# Altium schematic symbol library Linear Technology Power Management Switching Regulator LTC1174-LTC3901.SchLib: 2647 symbols (part 47 of 197) (continued)
## LTC3528BEDDB-2#TRPBF (continued)

## LTC3528EDDB#PBF
designator U?
1 A, 1 MHz Synchronous Step-Up DC/DC Converter, 8-pin SON (DDB-8), -40 to 125 degC, Pb-Free; Manufacturer: Linear Technology; PartNumber: LTC3528EDDB#PBF; Number of Outputs: 1; DatasheetVersion: Rev. D; PackageVersion: Rev. B, 06/2010; PackageReference: DDB-8; PackageDescription: 8-Pin Plastic DFN, Body 3 x 2 mm, Pitch 0.5 mm; Supplier 1: Newark; Supplier Part Number 1: 78T3199; RoHS: TRUE; Mounting Technology: Surface Mount; Code_JEDEC: MO-229; ComponentLink1Description: Manufacturer URL; ComponentLink1URL: http://www.linear.com/; ComponentLink2Description: Datasheet; ComponentLink2URL: http://cds.linear.com/docs/en/datasheet/3528bfd.pdf; ComponentLink3Description: Package Specification; ComponentLink3URL: http://cds.linear.com/docs/en/packaging/DFN_8_05-08-1702.pdf
footprint LT-DDB-8_V (SON, 8-Leads, Body 3x2mm, Pitch 0.5mm, Thermal Pad 2.2x0.61mm)
pins: 1 ~{SHDN} (in) "Logic Controlled Shutdown Input. There is an internal 4Mohm pull-down resistor on this pin.", 2 FB (in) "Feedback Input. Connect resistor divider tap to this pin.", 3 PGOOD (oc) "Power Good Comparator Output. This open-drain output is low when VFB < 10% from its regulation voltage.", 4 VOUT (power) "Output Voltage Sense and Drain Connection of the Internal Synchronous Rectifier. PCB trace length from VOUT to the output filter capacitor (4.7uF minimum) should be as short and wide as possible.", 5 SW "Switch Pin. Connect inductor between SW and VIN. Keep PCB trace lengths as short and wide as possible to reduce EMI. If the inductor current falls to zero, or S\H\D\N\ is low, an internal anti-ringing switch is connected (See Datasheet)", 6 PGND (power) "Power Ground. Provide a short direct PCB path between PGND and the (-) side of the input and output capacitors.", 7 SGND (power) "Signal Ground. Provide a short direct PCB path between SGND and the (-) side of the input and output capacitors.", 8 VIN (power) "Battery Input Voltage. Connect a minimum of 1uF ceramic decoupling capacitor from this pin to ground.", 9 EP (power) "The exposed pad must be soldered to the PCB ground plane. It serves as another ground connection and as a means of conducting heat away from the die."

## LTC3528EDDB#TRMPBF
designator U?
1 A, 1 MHz Synchronous Step-Up DC/DC Converter, 8-pin SON (DDB-8), -40 to 125 degC, Pb-Free, Mini Tape and Reel; Manufacturer: Linear Technology; PartNumber: LTC3528EDDB#TRMPBF; Number of Outputs: 1; DatasheetVersion: Rev. D; PackageVersion: Rev. B, 06/2010; PackageReference: DDB-8; PackageDescription: 8-Pin Plastic DFN, Body 3 x 2 mm, Pitch 0.5 mm; Supplier 1: Digi-Key; Supplier Part Number 1: LTC3528EDDB#TRMPBFTR-ND; Supplier 2: Digi-Key; Supplier Part Number 2: LTC3528EDDB#TRMPBFCT-ND; Supplier 3: Digi-Key; Supplier Part Number 3: LTC3528EDDB#TRMPBFDKR-ND; Packing: Mini Tape and Reel; RoHS: TRUE; Mounting Technology: Surface Mount; Code_JEDEC: MO-229; ComponentLink1Description: Manufacturer URL; ComponentLink1URL: http://www.linear.com/; ComponentLink2Description: Datasheet; ComponentLink2URL: http://cds.linear.com/docs/en/datasheet/3528bfd.pdf; ComponentLink3Description: Package Specification; ComponentLink3URL: http://cds.linear.com/docs/en/packaging/DFN_8_05-08-1702.pdf
footprint LT-DDB-8_V (SON, 8-Leads, Body 3x2mm, Pitch 0.5mm, Thermal Pad 2.2x0.61mm)
pins: 1 ~{SHDN} (in) "Logic Controlled Shutdown Input. There is an internal 4Mohm pull-down resistor on this pin.", 2 FB (in) "Feedback Input. Connect resistor divider tap to this pin.", 3 PGOOD (oc) "Power Good Comparator Output. This open-drain output is low when VFB < 10% from its regulation voltage.", 4 VOUT (power) "Output Voltage Sense and Drain Connection of the Internal Synchronous Rectifier. PCB trace length from VOUT to the output filter capacitor (4.7uF minimum) should be as short and wide as possible.", 5 SW "Switch Pin. Connect inductor between SW and VIN. Keep PCB trace lengths as short and wide as possible to reduce EMI. If the inductor current falls to zero, or S\H\D\N\ is low, an internal anti-ringing switch is connected (See Datasheet)", 6 PGND (power) "Power Ground. Provide a short direct PCB path between PGND and the (-) side of the input and output capacitors.", 7 SGND (power) "Signal Ground. Provide a short direct PCB path between SGND and the (-) side of the input and output capacitors.", 8 VIN (power) "Battery Input Voltage. Connect a minimum of 1uF ceramic decoupling capacitor from this pin to ground.", 9 EP (power) "The exposed pad must be soldered to the PCB ground plane. It serves as another ground connection and as a means of conducting heat away from the die."

## LTC3528EDDB#TRPBF
designator U?
1 A, 1 MHz Synchronous Step-Up DC/DC Converter, 8-pin SON (DDB-8), -40 to 125 degC, Pb-Free, Tape and Reel; Manufacturer: Linear Technology; PartNumber: LTC3528EDDB#TRPBF; Number of Outputs: 1; DatasheetVersion: Rev. D; PackageVersion: Rev. B, 06/2010; PackageReference: DDB-8; PackageDescription: 8-Pin Plastic DFN, Body 3 x 2 mm, Pitch 0.5 mm; Supplier 1: Digi-Key; Supplier Part Number 1: LTC3528EDDB#TRPBF-ND; Supplier 2: Newark; Supplier Part Number 2: 56M7923; Packing: Tape and Reel; RoHS: TRUE; Mounting Technology: Surface Mount; Code_JEDEC: MO-229; ComponentLink1Description: Manufacturer URL; ComponentLink1URL: http://www.linear.com/; ComponentLink2Description: Datasheet; ComponentLink2URL: http://cds.linear.com/docs/en/datasheet/3528bfd.pdf; ComponentLink3Description: Package Specification; ComponentLink3URL: http://cds.linear.com/docs/en/packaging/DFN_8_05-08-1702.pdf
footprint LT-DDB-8_V (SON, 8-Leads, Body 3x2mm, Pitch 0.5mm, Thermal Pad 2.2x0.61mm)
pins: 1 ~{SHDN} (in) "Logic Controlled Shutdown Input. There is an internal 4Mohm pull-down resistor on this pin.", 2 FB (in) "Feedback Input. Connect resistor divider tap to this pin.", 3 PGOOD (oc) "Power Good Comparator Output. This open-drain output is low when VFB < 10% from its regulation voltage.", 4 VOUT (power) "Output Voltage Sense and Drain Connection of the Internal Synchronous Rectifier. PCB trace length from VOUT to the output filter capacitor (4.7uF minimum) should be as short and wide as possible.", 5 SW "Switch Pin. Connect inductor between SW and VIN. Keep PCB trace lengths as short and wide as possible to reduce EMI. If the inductor current falls to zero, or S\H\D\N\ is low, an internal anti-ringing switch is connected (See Datasheet)", 6 PGND (power) "Power Ground. Provide a short direct PCB path between PGND and the (-) side of the input and output capacitors.", 7 SGND (power) "Signal Ground. Provide a short direct PCB path between SGND and the (-) side of the input and output capacitors.", 8 VIN (power) "Battery Input Voltage. Connect a minimum of 1uF ceramic decoupling capacitor from this pin to ground.", 9 EP (power) "The exposed pad must be soldered to the PCB ground plane. It serves as another ground connection and as a means of conducting heat away from the die."

## LTC3528EDDB-2#PBF
designator U?
1 A, 2 MHz Synchronous Step-Up DC/DC Converter, 8-pin SON (DDB-8), -40 to 125 degC, Pb-Free; Manufacturer: Linear Technology; PartNumber: LTC3528EDDB-2#PBF; Number of Outputs: 1; DatasheetVersion: Rev. B; PackageVersion: Rev. B, 06/2010; PackageReference: DDB-8; PackageDescription: 8-Pin Plastic DFN, Body 3 x 2 mm, Pitch 0.5 mm; Supplier 1: Farnell; Supplier Part Number 1: 2102650; Supplier 2: Newark; Supplier Part Number 2: 51R1507; RoHS: TRUE; Mounting Technology: Surface Mount; Code_JEDEC: MO-229; ComponentLink1Description: Manufacturer URL; ComponentLink1URL: http://www.linear.com/; ComponentLink2Description: Datasheet; ComponentLink2URL: http://cds.linear.com/docs/en/datasheet/35282fb.pdf; ComponentLink3Description: Package Specification; ComponentLink3URL: http://cds.linear.com/docs/en/packaging/DFN_8_05-08-1702.pdf
footprint LT-DDB-8_V (SON, 8-Leads, Body 3x2mm, Pitch 0.5mm, Thermal Pad 2.2x0.61mm)
pins: 1 ~{SHDN} (in) "Logic Controlled Shutdown Input. There is an internal 4M pull-down resistor on this pin.", 2 FB (in) "Feedback Input. Connect resistor divider tap to this pin.", 3 PGOOD (oc) "Power Good Comparator Output. This open-drain output is low when VFB < 10% from its regulation voltage.", 4 VOUT (in) "Output Voltage Sense and Drain Connection of the Internal Synchronous Rectifier. PCB trace length from VOUT to the output filter capacitor (4.7uF minimum) should be as short and wide as possible.", 5 SW "Switch Pin. Connect inductor between SW and VIN. Keep PCB trace lengths as short and wide as possible to reduce EMI. If the inductor current falls to zero, or S\H\D\N\ is low, an internal anti-ringing switch is connected (See Datasheet)", 6 PGND (power) "Power Ground. Provide a short direct PCB path between PGND and the (-) side of the input and output capacitors.", 7 SGND (power) "Signal Ground. Provide a short direct PCB path between SGND and the (-) side of the input and output capacitors.", 8 VIN (power) "Battery Input Voltage. Connect a minimum of 1uF ceramic decoupling capacitor from this pin to ground.", 9 EP (power) "The exposed pad must be soldered to the PCB ground plane. It serves as another ground connection and as a means of conducting heat away from the die."

## LTC3528EDDB-2#TRMPBF
designator U?
1 A, 2 MHz Synchronous Step-Up DC/DC Converter, 8-pin SON (DDB-8), -40 to 125 degC, Pb-Free, Mini Tape and Reel; Manufacturer: Linear Technology; PartNumber: LTC3528EDDB-2#TRMPBF; Number of Outputs: 1; DatasheetVersion: Rev. B; PackageVersion: Rev. B, 06/2010; PackageReference: DDB-8; PackageDescription: 8-Pin Plastic DFN, Body 3 x 2 mm, Pitch 0.5 mm; Supplier 1: Digi-Key; Supplier Part Number 1: LTC3528EDDB-2#TRMPBF-ND; Packing: Mini Tape and Reel; RoHS: TRUE; Mounting Technology: Surface Mount; Code_JEDEC: MO-229; ComponentLink1Description: Manufacturer URL; ComponentLink1URL: http://www.linear.com/; ComponentLink2Description: Datasheet; ComponentLink2URL: http://cds.linear.com/docs/en/datasheet/35282fb.pdf; ComponentLink3Description: Package Specification; ComponentLink3URL: http://cds.linear.com/docs/en/packaging/DFN_8_05-08-1702.pdf
footprint LT-DDB-8_V (SON, 8-Leads, Body 3x2mm, Pitch 0.5mm, Thermal Pad 2.2x0.61mm)
pins: 1 ~{SHDN} (in) "Logic Controlled Shutdown Input. There is an internal 4M pull-down resistor on this pin.", 2 FB (in) "Feedback Input. Connect resistor divider tap to this pin.", 3 PGOOD (oc) "Power Good Comparator Output. This open-drain output is low when VFB < 10% from its regulation voltage.", 4 VOUT (in) "Output Voltage Sense and Drain Connection of the Internal Synchronous Rectifier. PCB trace length from VOUT to the output filter capacitor (4.7uF minimum) should be as short and wide as possible.", 5 SW "Switch Pin. Connect inductor between SW and VIN. Keep PCB trace lengths as short and wide as possible to reduce EMI. If the inductor current falls to zero, or S\H\D\N\ is low, an internal anti-ringing switch is connected (See Datasheet)", 6 PGND (power) "Power Ground. Provide a short direct PCB path between PGND and the (-) side of the input and output capacitors.", 7 SGND (power) "Signal Ground. Provide a short direct PCB path between SGND and the (-) side of the input and output capacitors.", 8 VIN (power) "Battery Input Voltage. Connect a minimum of 1uF ceramic decoupling capacitor from this pin to ground.", 9 EP (power) "The exposed pad must be soldered to the PCB ground plane. It serves as another ground connection and as a means of conducting heat away from the die."

## LTC3528EDDB-2#TRPBF
designator U?
1 A, 2 MHz Synchronous Step-Up DC/DC Converter, 8-pin SON (DDB-8), -40 to 125 degC, Pb-Free, Tape and Reel; Manufacturer: Linear Technology; PartNumber: LTC3528EDDB-2#TRPBF; Number of Outputs: 1; DatasheetVersion: Rev. B; PackageVersion: Rev. B, 06/2010; PackageReference: DDB-8; PackageDescription: 8-Pin Plastic DFN, Body 3 x 2 mm, Pitch 0.5 mm; Supplier 1: Digi-Key; Supplier Part Number 1: LTC3528EDDB-2#TRPBF-ND; Packing: Tape and Reel; RoHS: TRUE; Mounting Technology: Surface Mount; Code_JEDEC: MO-229; ComponentLink1Description: Manufacturer URL; ComponentLink1URL: http://www.linear.com/; ComponentLink2Description: Datasheet; ComponentLink2URL: http://cds.linear.com/docs/en/datasheet/35282fb.pdf; ComponentLink3Description: Package Specification; ComponentLink3URL: http://cds.linear.com/docs/en/packaging/DFN_8_05-08-1702.pdf
footprint LT-DDB-8_V (SON, 8-Leads, Body 3x2mm, Pitch 0.5mm, Thermal Pad 2.2x0.61mm)
pins: 1 ~{SHDN} (in) "Logic Controlled Shutdown Input. There is an internal 4M pull-down resistor on this pin.", 2 FB (in) "Feedback Input. Connect resistor divider tap to this pin.", 3 PGOOD (oc) "Power Good Comparator Output. This open-drain output is low when VFB < 10% from its regulation voltage.", 4 VOUT (in) "Output Voltage Sense and Drain Connection of the Internal Synchronous Rectifier. PCB trace length from VOUT to the output filter capacitor (4.7uF minimum) should be as short and wide as possible.", 5 SW "Switch Pin. Connect inductor between SW and VIN. Keep PCB trace lengths as short and wide as possible to reduce EMI. If the inductor current falls to zero, or S\H\D\N\ is low, an internal anti-ringing switch is connected (See Datasheet)", 6 PGND (power) "Power Ground. Provide a short direct PCB path between PGND and the (-) side of the input and output capacitors.", 7 SGND (power) "Signal Ground. Provide a short direct PCB path between SGND and the (-) side of the input and output capacitors.", 8 VIN (power) "Battery Input Voltage. Connect a minimum of 1uF ceramic decoupling capacitor from this pin to ground.", 9 EP (power) "The exposed pad must be soldered to the PCB ground plane. It serves as another ground connection and as a means of conducting heat away from the die."

## LTC3529EDCB#PBF
designator U?
1.5 A, 1.5 MHz Step-Up DC/DC Converter, 8-pin SON (DCB-8), -40 to 85 degC, Pb-Free; Manufacturer: Linear Technology; PartNumber: LTC3529EDCB#PBF; Number of Outputs: 1; DatasheetVersion: Rev. B; PackageVersion: Rev. A, 06/2010; PackageReference: DCB-8; PackageDescription: 8-Pin Plastic DFN, Body 2 x 3 mm, Pitch 0.45 mm; Supplier 1: Newark; Supplier Part Number 1: 51P3122; RoHS: TRUE; Mounting Technology: Surface Mount; ComponentLink1Description: Manufacturer URL; ComponentLink1URL: http://www.linear.com/; ComponentLink2Description: Datasheet; ComponentLink2URL: http://cds.linear.com/docs/en/datasheet/3529fb.pdf; ComponentLink3Description: Package Specification; ComponentLink3URL: http://cds.linear.com/docs/en/packaging/DFN_8_05-08-1718.pdf
footprint LT-DCB-8_V (SON, 8-Leads, Body 3x2mm, Pitch 0.45mm, Thermal Pad 1.65x1.35mm)
pins: 1 VOUT (power) "Converter Output, Voltage Sense Input and Drain of the Internal Synchronous Rectifier MOSFET. Driver bias is derived from VOUT. PCB trace length from VOUT to the output filter capacitor(s) should be as short and wide as (See Datasheet)", 2 SW "Switch Node. This node connects to one side of the inductor. Keep PCB traces as short and wide as possible to reduce EMI and voltage overshoot. If the inductor current falls to zero, or S\H\D\N\ is low, an internal 100ohm (See Datasheet)", 3 ~{SHDN} (in) "Active-Low Shutdown Input. Forcing this pin above 1V enables the converter. Forcing this pin below 0.35V disables the converter. Do not float this pin.", 4 PGND (power) "High Current Ground Connection. The PCB trace connecting this pin to ground should be as short and as wide as possible.", 5 ~{FAULT} (oc) "Open-Drain Fault Indicator Output. Pulls low when an overcurrent condition exists for more than 22ms.", 6 SNSGND (power) "This pin must be connected to ground.", 7 RST (in) "Logic Input to Select Automatic Restart or Latchoff Following a Fault Shutdown. RST = High: Auto-reset mode. In this mode, the LTC3529 will automatically attempt to restart 22ms (typically) after a fault shutdown. RST = Low: (See Datasheet)", 8 VIN (power) "Input Supply Pin.", 9 EP (power) "Small Signal Ground. This is the ground reference for the internal circuitry of the LTC3529 and must be connected directly to ground."

## LTC3529EDCB#TRMPBF
designator U?
1.5 A, 1.5 MHz Step-Up DC/DC Converter, 8-pin SON (DCB-8), -40 to 85 degC, Pb-Free, Mini Tape and Reel; Manufacturer: Linear Technology; PartNumber: LTC3529EDCB#TRMPBF; Number of Outputs: 1; DatasheetVersion: Rev. B; PackageVersion: Rev. A, 06/2010; PackageReference: DCB-8; PackageDescription: 8-Pin Plastic DFN, Body 2 x 3 mm, Pitch 0.45 mm; Supplier 1: Digi-Key; Supplier Part Number 1: LTC3529EDCB#TRMPBFTR-ND; Supplier 2: Digi-Key; Supplier Part Number 2: LTC3529EDCB#TRMPBFCT-ND; Supplier 3: Digi-Key; Supplier Part Number 3: LTC3529EDCB#TRMPBFDKR-ND; Supplier 4: Farnell; Supplier Part Number 4: 1715211; Supplier 5: Newark; Supplier Part Number 5: 56P3080; Packing: Mini Tape and Reel; RoHS: TRUE; Mounting Technology: Surface Mount; ComponentLink1Description: Manufacturer URL; ComponentLink1URL: http://www.linear.com/; ComponentLink2Description: Datasheet; ComponentLink2URL: http://cds.linear.com/docs/en/datasheet/3529fb.pdf; ComponentLink3Description: Package Specification; ComponentLink3URL: http://cds.linear.com/docs/en/packaging/DFN_8_05-08-1718.pdf
footprint LT-DCB-8_V (SON, 8-Leads, Body 3x2mm, Pitch 0.45mm, Thermal Pad 1.65x1.35mm)
pins: 1 VOUT (power) "Converter Output, Voltage Sense Input and Drain of the Internal Synchronous Rectifier MOSFET. Driver bias is derived from VOUT. PCB trace length from VOUT to the output filter capacitor(s) should be as short and wide as (See Datasheet)", 2 SW "Switch Node. This node connects to one side of the inductor. Keep PCB traces as short and wide as possible to reduce EMI and voltage overshoot. If the inductor current falls to zero, or S\H\D\N\ is low, an internal 100ohm (See Datasheet)", 3 ~{SHDN} (in) "Active-Low Shutdown Input. Forcing this pin above 1V enables the converter. Forcing this pin below 0.35V disables the converter. Do not float this pin.", 4 PGND (power) "High Current Ground Connection. The PCB trace connecting this pin to ground should be as short and as wide as possible.", 5 ~{FAULT} (oc) "Open-Drain Fault Indicator Output. Pulls low when an overcurrent condition exists for more than 22ms.", 6 SNSGND (power) "This pin must be connected to ground.", 7 RST (in) "Logic Input to Select Automatic Restart or Latchoff Following a Fault Shutdown. RST = High: Auto-reset mode. In this mode, the LTC3529 will automatically attempt to restart 22ms (typically) after a fault shutdown. RST = Low: (See Datasheet)", 8 VIN (power) "Input Supply Pin.", 9 EP (power) "Small Signal Ground. This is the ground reference for the internal circuitry of the LTC3529 and must be connected directly to ground."

## LTC3529EDCB#TRPBF
designator U?
1.5 A, 1.5 MHz Step-Up DC/DC Converter, 8-pin SON (DCB-8), -40 to 85 degC, Pb-Free, Tape and Reel; Manufacturer: Linear Technology; PartNumber: LTC3529EDCB#TRPBF; Number of Outputs: 1; DatasheetVersion: Rev. B; PackageVersion: Rev. A, 06/2010; PackageReference: DCB-8; PackageDescription: 8-Pin Plastic DFN, Body 2 x 3 mm, Pitch 0.45 mm; Supplier 1: Digi-Key; Supplier Part Number 1: LTC3529EDCB#TRPBF-ND; Supplier 2: Newark; Supplier Part Number 2: 56P3081; Packing: Tape and Reel; RoHS: TRUE; Mounting Technology: Surface Mount; ComponentLink1Description: Manufacturer URL; ComponentLink1URL: http://www.linear.com/; ComponentLink2Description: Datasheet; ComponentLink2URL: http://cds.linear.com/docs/en/datasheet/3529fb.pdf; ComponentLink3Description: Package Specification; ComponentLink3URL: http://cds.linear.com/docs/en/packaging/DFN_8_05-08-1718.pdf
footprint LT-DCB-8_V (SON, 8-Leads, Body 3x2mm, Pitch 0.45mm, Thermal Pad 1.65x1.35mm)
pins: 1 VOUT (power) "Converter Output, Voltage Sense Input and Drain of the Internal Synchronous Rectifier MOSFET. Driver bias is derived from VOUT. PCB trace length from VOUT to the output filter capacitor(s) should be as short and wide as (See Datasheet)", 2 SW "Switch Node. This node connects to one side of the inductor. Keep PCB traces as short and wide as possible to reduce EMI and voltage overshoot. If the inductor current falls to zero, or S\H\D\N\ is low, an internal 100ohm (See Datasheet)", 3 ~{SHDN} (in) "Active-Low Shutdown Input. Forcing this pin above 1V enables the converter. Forcing this pin below 0.35V disables the converter. Do not float this pin.", 4 PGND (power) "High Current Ground Connection. The PCB trace connecting this pin to ground should be as short and as wide as possible.", 5 ~{FAULT} (oc) "Open-Drain Fault Indicator Output. Pulls low when an overcurrent condition exists for more than 22ms.", 6 SNSGND (power) "This pin must be connected to ground.", 7 RST (in) "Logic Input to Select Automatic Restart or Latchoff Following a Fault Shutdown. RST = High: Auto-reset mode. In this mode, the LTC3529 will automatically attempt to restart 22ms (typically) after a fault shutdown. RST = Low: (See Datasheet)", 8 VIN (power) "Input Supply Pin.", 9 EP (power) "Small Signal Ground. This is the ground reference for the internal circuitry of the LTC3529 and must be connected directly to ground."

## LTC3530EDD
designator U?
Wide Input Voltage Synchronous Buck-Boost DC/DC Converter, 10-pin SON (DD-10), -40 to 85 degC; Manufacturer: Linear Technology; PartNumber: LTC3530EDD; Frequency Adjust Range: 300kHz - 2MHz; Number of Outputs: 1; DatasheetVersion: Rev. B; PackageVersion: Rev. C, 06/2010; PackageReference: DD-10; PackageDescription: 10-Pin Plastic DFN, Body 3 x 3 mm, Pitch 0.5 mm; RoHS: FALSE; Mounting Technology: Surface Mount; Code_JEDEC: MO-229; ComponentLink1Description: Manufacturer URL; ComponentLink1URL: http://www.linear.com/; ComponentLink2Description: Datasheet; ComponentLink2URL: http://cds.linear.com/docs/en/datasheet/3530fb.pdf; ComponentLink3Description: Package Specification; ComponentLink3URL: http://cds.linear.com/docs/en/packaging/DFN_10_05-08-1699.pdf
footprint LT-DD-10_V (SON, 10-Leads, Body 3x3mm, Pitch 0.5mm, Thermal Pad 2.38x1.65mm)
pins: 1 RT "Programs the Frequency of the Internal Oscillator. Connect a resister from RT to ground. f(kHz) = 33,170/RT (kohm)", 2 BURST (in) "Used to Set the Automatic Burst Mode Threshold. Connect a resistor and capacitor in parallel from this pin to ground. See the Applications Information section for component value selection. For manual control, ground the pin (See Datasheet)", 3 SW1 "Switch Pin Where the Internal Switches A and B are Connected. Connect inductor from SW1 to SW2. An optional Schottky diode can be connnected from SW1 to ground for a moderate efficiency improvement. Minimize trace length to (See Datasheet)", 4 SW2 "Switch Pin Where the Internal Switches C and D are Connected. For applications with output voltages over 4.3V, a Schottky diode is required from SW2 to VOUT to ensure the SW pin does not exhibit excessive voltage.", 5 GND (power) "Ground for the IC.", 6 VOUT (power) "Output of the Synchronous Rectifier. A filter capacitor is placed from VOUT to GND. A ceramic bypass capacitor is recommended as close to the VOUT and GND pins as possible.", 7 VIN (power) "Input Supply Voltage. Internal VCC for the IC. A 10uF ceramic capacitor is recommended as close to the VIN and GND pins as possible.", 8 ~{SHDN}/SS (in) "Combined Soft-Start and Shutdown. Applied voltage <0.4V shuts down the IC. Tie to >1.4V to enable the IC and >1.6V to ensure the error amp is not clamped from soft-start. An R-C from the shutdown command signal to this pin (See Datasheet)", 9 FB (in) "Feedback Pin. Connect resistor divider tap here. The output voltage can be adjusted from 1.8V to 5.25V. The feedback reference is typically 1.215V.", 10 VC "Error Amp Output. An R-C network is connected from this pin to FB for loop compensation. Refer to “Closing the Feedback Loop?section for component selection guidelines. During Burst Mode operation, VC is interna(See Datasheet)", 11 EP (power) "Ground. This pin must be soldered to the PCB and electrically connected to ground."

## LTC3530EDD#PBF
designator U?
Wide Input Voltage Synchronous Buck-Boost DC/DC Converter, 10-pin SON (DD-10), -40 to 85 degC, Pb-Free; Manufacturer: Linear Technology; PartNumber: LTC3530EDD#PBF; Frequency Adjust Range: 300kHz - 2MHz; Number of Outputs: 1; DatasheetVersion: Rev. B; PackageVersion: Rev. C, 06/2010; PackageReference: DD-10; PackageDescription: 10-Pin Plastic DFN, Body 3 x 3 mm, Pitch 0.5 mm; Supplier 1: Digi-Key; Supplier Part Number 1: LTC3530EDD#PBF-ND; Supplier 2: Newark; Supplier Part Number 2: 56M7925; RoHS: TRUE; Mounting Technology: Surface Mount; Code_JEDEC: MO-229; ComponentLink1Description: Manufacturer URL; ComponentLink1URL: http://www.linear.com/; ComponentLink2Description: Datasheet; ComponentLink2URL: http://cds.linear.com/docs/en/datasheet/3530fb.pdf; ComponentLink3Description: Package Specification; ComponentLink3URL: http://cds.linear.com/docs/en/packaging/DFN_10_05-08-1699.pdf
footprint LT-DD-10_V (SON, 10-Leads, Body 3x3mm, Pitch 0.5mm, Thermal Pad 2.38x1.65mm)
pins: 1 RT "Programs the Frequency of the Internal Oscillator. Connect a resister from RT to ground. f(kHz) = 33,170/RT (kohm)", 2 BURST (in) "Used to Set the Automatic Burst Mode Threshold. Connect a resistor and capacitor in parallel from this pin to ground. See the Applications Information section for component value selection. For manual control, ground the pin (See Datasheet)", 3 SW1 "Switch Pin Where the Internal Switches A and B are Connected. Connect inductor from SW1 to SW2. An optional Schottky diode can be connnected from SW1 to ground for a moderate efficiency improvement. Minimize trace length to (See Datasheet)", 4 SW2 "Switch Pin Where the Internal Switches C and D are Connected. For applications with output voltages over 4.3V, a Schottky diode is required from SW2 to VOUT to ensure the SW pin does not exhibit excessive voltage.", 5 GND (power) "Ground for the IC.", 6 VOUT (power) "Output of the Synchronous Rectifier. A filter capacitor is placed from VOUT to GND. A ceramic bypass capacitor is recommended as close to the VOUT and GND pins as possible.", 7 VIN (power) "Input Supply Voltage. Internal VCC for the IC. A 10uF ceramic capacitor is recommended as close to the VIN and GND pins as possible.", 8 ~{SHDN}/SS (in) "Combined Soft-Start and Shutdown. Applied voltage <0.4V shuts down the IC. Tie to >1.4V to enable the IC and >1.6V to ensure the error amp is not clamped from soft-start. An R-C from the shutdown command signal to this pin (See Datasheet)", 9 FB (in) "Feedback Pin. Connect resistor divider tap here. The output voltage can be adjusted from 1.8V to 5.25V. The feedback reference is typically 1.215V.", 10 VC "Error Amp Output. An R-C network is connected from this pin to FB for loop compensation. Refer to “Closing the Feedback Loop?section for component selection guidelines. During Burst Mode operation, VC is interna(See Datasheet)", 11 EP (power) "Ground. This pin must be soldered to the PCB and electrically connected to ground."

## LTC3530EDD#TR
designator U?
Wide Input Voltage Synchronous Buck-Boost DC/DC Converter, 10-pin SON (DD-10), -40 to 85 degC, Tape and Reel; Manufacturer: Linear Technology; PartNumber: LTC3530EDD#TR; Frequency Adjust Range: 300kHz - 2MHz; Number of Outputs: 1; DatasheetVersion: Rev. B; PackageVersion: Rev. C, 06/2010; PackageReference: DD-10; PackageDescription: 10-Pin Plastic DFN, Body 3 x 3 mm, Pitch 0.5 mm; Packing: Tape and Reel; RoHS: FALSE; Mounting Technology: Surface Mount; Code_JEDEC: MO-229; ComponentLink1Description: Manufacturer URL; ComponentLink1URL: http://www.linear.com/; ComponentLink2Description: Datasheet; ComponentLink2URL: http://cds.linear.com/docs/en/datasheet/3530fb.pdf; ComponentLink3Description: Package Specification; ComponentLink3URL: http://cds.linear.com/docs/en/packaging/DFN_10_05-08-1699.pdf
footprint LT-DD-10_V (SON, 10-Leads, Body 3x3mm, Pitch 0.5mm, Thermal Pad 2.38x1.65mm)
pins: 1 RT "Programs the Frequency of the Internal Oscillator. Connect a resister from RT to ground. f(kHz) = 33,170/RT (kohm)", 2 BURST (in) "Used to Set the Automatic Burst Mode Threshold. Connect a resistor and capacitor in parallel from this pin to ground. See the Applications Information section for component value selection. For manual control, ground the pin (See Datasheet)", 3 SW1 "Switch Pin Where the Internal Switches A and B are Connected. Connect inductor from SW1 to SW2. An optional Schottky diode can be connnected from SW1 to ground for a moderate efficiency improvement. Minimize trace length to (See Datasheet)", 4 SW2 "Switch Pin Where the Internal Switches C and D are Connected. For applications with output voltages over 4.3V, a Schottky diode is required from SW2 to VOUT to ensure the SW pin does not exhibit excessive voltage.", 5 GND (power) "Ground for the IC.", 6 VOUT (power) "Output of the Synchronous Rectifier. A filter capacitor is placed from VOUT to GND. A ceramic bypass capacitor is recommended as close to the VOUT and GND pins as possible.", 7 VIN (power) "Input Supply Voltage. Internal VCC for the IC. A 10uF ceramic capacitor is recommended as close to the VIN and GND pins as possible.", 8 ~{SHDN}/SS (in) "Combined Soft-Start and Shutdown. Applied voltage <0.4V shuts down the IC. Tie to >1.4V to enable the IC and >1.6V to ensure the error amp is not clamped from soft-start. An R-C from the shutdown command signal to this pin (See Datasheet)", 9 FB (in) "Feedback Pin. Connect resistor divider tap here. The output voltage can be adjusted from 1.8V to 5.25V. The feedback reference is typically 1.215V.", 10 VC "Error Amp Output. An R-C network is connected from this pin to FB for loop compensation. Refer to “Closing the Feedback Loop?section for component selection guidelines. During Burst Mode operation, VC is interna(See Datasheet)", 11 EP (power) "Ground. This pin must be soldered to the PCB and electrically connected to ground."

## LTC3530EDD#TRPBF
designator U?
Wide Input Voltage Synchronous Buck-Boost DC/DC Converter, 10-pin SON (DD-10), -40 to 85 degC, Pb-Free, Tape and Reel; Manufacturer: Linear Technology; PartNumber: LTC3530EDD#TRPBF; Frequency Adjust Range: 300kHz - 2MHz; Number of Outputs: 1; DatasheetVersion: Rev. B; PackageVersion: Rev. C, 06/2010; PackageReference: DD-10; PackageDescription: 10-Pin Plastic DFN, Body 3 x 3 mm, Pitch 0.5 mm; Supplier 1: Digi-Key; Supplier Part Number 1: LTC3530EDD#TRPBF-ND; Supplier 2: Newark; Supplier Part Number 2: 56M7927; Packing: Tape and Reel; RoHS: TRUE; Mounting Technology: Surface Mount; Code_JEDEC: MO-229; ComponentLink1Description: Manufacturer URL; ComponentLink1URL: http://www.linear.com/; ComponentLink2Description: Datasheet; ComponentLink2URL: http://cds.linear.com/docs/en/datasheet/3530fb.pdf; ComponentLink3Description: Package Specification; ComponentLink3URL: http://cds.linear.com/docs/en/packaging/DFN_10_05-08-1699.pdf
footprint LT-DD-10_V (SON, 10-Leads, Body 3x3mm, Pitch 0.5mm, Thermal Pad 2.38x1.65mm)
pins: 1 RT "Programs the Frequency of the Internal Oscillator. Connect a resister from RT to ground. f(kHz) = 33,170/RT (kohm)", 2 BURST (in) "Used to Set the Automatic Burst Mode Threshold. Connect a resistor and capacitor in parallel from this pin to ground. See the Applications Information section for component value selection. For manual control, ground the pin (See Datasheet)", 3 SW1 "Switch Pin Where the Internal Switches A and B are Connected. Connect inductor from SW1 to SW2. An optional Schottky diode can be connnected from SW1 to ground for a moderate efficiency improvement. Minimize trace length to (See Datasheet)", 4 SW2 "Switch Pin Where the Internal Switches C and D are Connected. For applications with output voltages over 4.3V, a Schottky diode is required from SW2 to VOUT to ensure the SW pin does not exhibit excessive voltage.", 5 GND (power) "Ground for the IC.", 6 VOUT (power) "Output of the Synchronous Rectifier. A filter capacitor is placed from VOUT to GND. A ceramic bypass capacitor is recommended as close to the VOUT and GND pins as possible.", 7 VIN (power) "Input Supply Voltage. Internal VCC for the IC. A 10uF ceramic capacitor is recommended as close to the VIN and GND pins as possible.", 8 ~{SHDN}/SS (in) "Combined Soft-Start and Shutdown. Applied voltage <0.4V shuts down the IC. Tie to >1.4V to enable the IC and >1.6V to ensure the error amp is not clamped from soft-start. An R-C from the shutdown command signal to this pin (See Datasheet)", 9 FB (in) "Feedback Pin. Connect resistor divider tap here. The output voltage can be adjusted from 1.8V to 5.25V. The feedback reference is typically 1.215V.", 10 VC "Error Amp Output. An R-C network is connected from this pin to FB for loop compensation. Refer to “Closing the Feedback Loop?section for component selection guidelines. During Burst Mode operation, VC is interna(See Datasheet)", 11 EP (power) "Ground. This pin must be soldered to the PCB and electrically connected to ground."

## LTC3530EMS
designator U?
Wide Input Voltage Synchronous Buck-Boost DC/DC Converter, 10-pin SOP (MS-10), -40 to 85 degC; Manufacturer: Linear Technology; PartNumber: LTC3530EMS; Frequency Adjust Range: 300kHz - 2MHz; Number of Outputs: 1; DatasheetVersion: Rev. B; PackageVersion: Rev. E, 06/2010; PackageReference: MS-10; PackageDescription: 10-Pin Plastic MSOP, Body 3 x 3 mm, Pitch 0.5 mm; RoHS: FALSE; Mounting Technology: Surface Mount; ComponentLink1Description: Manufacturer URL; ComponentLink1URL: http://www.linear.com/; ComponentLink2Description: Datasheet; ComponentLink2URL: http://cds.linear.com/docs/en/datasheet/3530fb.pdf; ComponentLink3Description: Package Specification; ComponentLink3URL: http://cds.linear.com/docs/en/packaging/05081661_F_MS.pdf
footprint LT-MS-10_N (SOP, 10-Leads, Body 3.1x3.1mm, Pitch 0.5mm, IPC Medium Density)
footprint LT-MS-10_L (SOP, 10-Leads, Body 3.1x3.1mm, Pitch 0.5mm, IPC High Density)
footprint LT-MS-10_M (SOP, 10-Leads, Body 3.1x3.1mm, Pitch 0.5mm, IPC Low Density)
pins: 1 RT, 2 BURST (in) "Used to Set the Automatic Burst Mode Operation Threshold. Place a resistor and capacitor in parallel from this pin to ground. See the Applications Information section for component value selection. For manual control, ground (See Datasheet)", 3 SW1 "Switch Pin Where the Internal Switches A and B are Connected. Connect inductor from SW1 to SW2. An optional Schottky diode can be connected from SW1 to ground. Minimize trace length to minimize EMI.", 4 SW2 "Switch Pin Where the Internal Switches C and D are Connected. For applications with output voltages over 4.3V, a Schottky diode is required from SW2 to VOUT to ensure SW2 does not exhibit excess voltage.", 5 GND (power) "Signal and Power Ground for the IC.", 6 VOUT (power) "Output of the Synchronous Rectifier. A filter capacitor is placed from VOUT to GND.", 7 VIN (power) "Input Supply Pin. Supplies current to the inductor through SW1 and supplies internal VCC for the IC. A ceramic bypass capacitor as close to the VIN pin and GND (Pin 5) is required.", 8 ~{SHDN}/SS (in), 9 FB (in), 10 VC "Error Amp Output: A frequency compensation network is connected from this pin to the FB pin to compensate the loop. Refer to the Applications Information section for component value selection."